# Altium integrated library Wuerth Elektronik Common Mode Power Line Choke.IntLib: 130 symbols
Pins are listed as number, name and electrical type; pins without a type are passive.

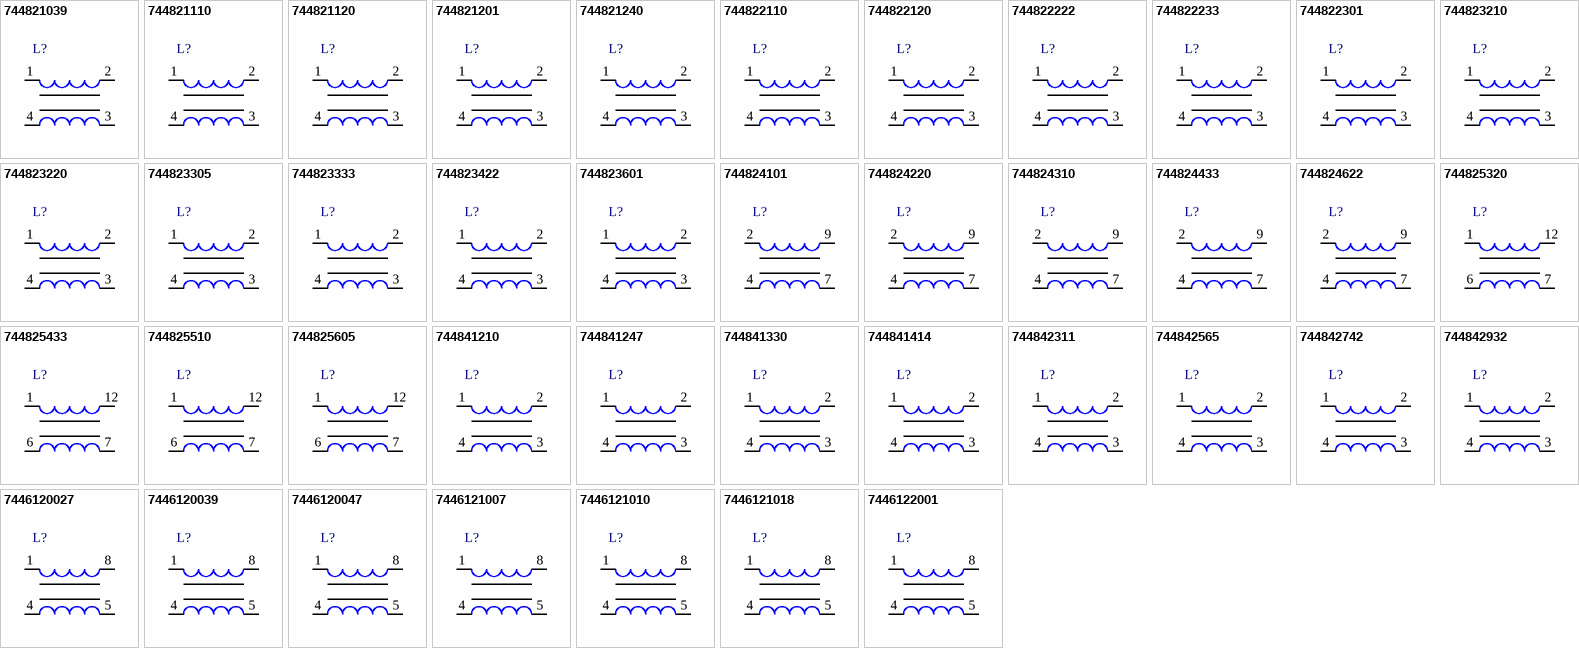
[diagram p0: symbols 744821039 to 7446122001]

## 744821039
designator L?
THT Common Mode Power Line Choke WE-CMB, L = 39.0 mH; Inductance: 39.0 mH; DatasheetVersion: ver 1, Oct-2004; PackageVersion: 2004; PackageReference: WE-CMB-XS; PackageDescription: THT Inductor, 2-Leads, Body 15.0 x 7.5 mm; ComponentLink1Description: Manufacturer URL; ComponentLink1URL: http://www.we-online.com; ComponentLink2Description: Datasheet; ComponentLink2URL: http://www.we-online.de/katalog/media/pdf/744821039.pdf
footprint WE-CMB-XS (THT Inductor, 2-Leads, Body 15.0x7.5x18.0 mm)
pins: 1, 2, 3, 4

## 744821110
designator L?
THT Common Mode Power Line Choke WE-CMB, L = 10.0 mH; Inductance: 10.0 mH; DatasheetVersion: ver 1, Oct-2004; PackageVersion: 2004; PackageReference: WE-CMB-XS; PackageDescription: THT Inductor, 2-Leads, Body 15.0 x 7.5 mm; ComponentLink1Description: Manufacturer URL; ComponentLink1URL: http://www.we-online.com; ComponentLink2Description: Datasheet; ComponentLink2URL: http://www.we-online.de/katalog/media/pdf/744821110.pdf
footprint WE-CMB-XS (THT Inductor, 2-Leads, Body 15.0x7.5x18.0 mm)
pins: 1, 2, 3, 4

## 744821120
designator L?
THT Common Mode Power Line Choke WE-CMB, L = 20.0 mH; Inductance: 20.0 mH; DatasheetVersion: ver 2, Jun-2005; PackageVersion: 2004; PackageReference: WE-CMB-XS; PackageDescription: THT Inductor, 2-Leads, Body 15.0 x 7.5 mm; ComponentLink1Description: Manufacturer URL; ComponentLink1URL: http://www.we-online.com; ComponentLink2Description: Datasheet; ComponentLink2URL: http://www.we-online.de/katalog/media/pdf/744821120.pdf
footprint WE-CMB-XS (THT Inductor, 2-Leads, Body 15.0x7.5x18.0 mm)
pins: 1, 2, 3, 4

## 744821201
designator L?
THT Common Mode Power Line Choke WE-CMB, L = 1.00 mH; Inductance: 1.00 mH; DatasheetVersion: ver 1, Oct-2004; PackageVersion: 2004; PackageReference: WE-CMB-XS; PackageDescription: THT Inductor, 2-Leads, Body 15.0 x 7.5 mm; ComponentLink1Description: Manufacturer URL; ComponentLink1URL: http://www.we-online.com; ComponentLink2Description: Datasheet; ComponentLink2URL: http://www.we-online.de/katalog/media/pdf/744821201.pdf
footprint WE-CMB-XS (THT Inductor, 2-Leads, Body 15.0x7.5x18.0 mm)
pins: 1, 2, 3, 4

## 744821240
designator L?
THT Common Mode Power Line Choke WE-CMB, L = 4.00 mH; Inductance: 4.00 mH; DatasheetVersion: ver 1, Oct-2004; PackageVersion: 2004; PackageReference: WE-CMB-XS; PackageDescription: THT Inductor, 2-Leads, Body 15.0 x 7.5 mm; ComponentLink1Description: Manufacturer URL; ComponentLink1URL: http://www.we-online.com; ComponentLink2Description: Datasheet; ComponentLink2URL: http://www.we-online.de/katalog/media/pdf/744821240.pdf
footprint WE-CMB-XS (THT Inductor, 2-Leads, Body 15.0x7.5x18.0 mm)
pins: 1, 2, 3, 4

## 744822110
designator L?
THT Common Mode Power Line Choke WE-CMB, L = 10.0 mH; Inductance: 10.0 mH; DatasheetVersion: ver 4, Oct-2004; PackageVersion: 2004; PackageReference: WE-CMB-S; PackageDescription: THT Inductor, 4-Leads, Body 17.5 x 13.0 mm; ComponentLink1Description: Manufacturer URL; ComponentLink1URL: http://www.we-online.com; ComponentLink2Description: Datasheet; ComponentLink2URL: http://www.we-online.de/katalog/media/pdf/744822110.pdf
footprint WE-CMB-S (THT Inductor, 4-Leads, Body 17.5x13.0x22.0 mm)
pins: 1, 2, 3, 4

## 744822120
designator L?
THT Common Mode Power Line Choke WE-CMB, L = 20.0 mH; Inductance: 20.0 mH; DatasheetVersion: ver 4, Oct-2004; PackageVersion: 2004; PackageReference: WE-CMB-S; PackageDescription: THT Inductor, 4-Leads, Body 17.5 x 13.0 mm; ComponentLink1Description: Manufacturer URL; ComponentLink1URL: http://www.we-online.com; ComponentLink2Description: Datasheet; ComponentLink2URL: http://www.we-online.de/katalog/media/pdf/744822120.pdf
footprint WE-CMB-S (THT Inductor, 4-Leads, Body 17.5x13.0x22.0 mm)
pins: 1, 2, 3, 4

## 744822222
designator L?
THT Common Mode Power Line Choke WE-CMB, L = 2.20 mH; Inductance: 2.20 mH; DatasheetVersion: ver 4, Oct-2004; PackageVersion: 2004; PackageReference: WE-CMB-S; PackageDescription: THT Inductor, 4-Leads, Body 17.5 x 13.0 mm; ComponentLink1Description: Manufacturer URL; ComponentLink1URL: http://www.we-online.com; ComponentLink2Description: Datasheet; ComponentLink2URL: http://www.we-online.de/katalog/media/pdf/744822222.pdf
footprint WE-CMB-S (THT Inductor, 4-Leads, Body 17.5x13.0x22.0 mm)
pins: 1, 2, 3, 4

## 744822233
designator L?
THT Common Mode Power Line Choke WE-CMB, L = 3.30 mH; Inductance: 3.30 mH; DatasheetVersion: ver 4, Oct-2004; PackageVersion: 2004; PackageReference: WE-CMB-S; PackageDescription: THT Inductor, 4-Leads, Body 17.5 x 13.0 mm; ComponentLink1Description: Manufacturer URL; ComponentLink1URL: http://www.we-online.com; ComponentLink2Description: Datasheet; ComponentLink2URL: http://www.we-online.de/katalog/media/pdf/744822233.pdf
footprint WE-CMB-S (THT Inductor, 4-Leads, Body 17.5x13.0x22.0 mm)
pins: 1, 2, 3, 4

## 744822301
designator L?
THT Common Mode Power Line Choke WE-CMB, L = 1.00 mH; Inductance: 1.00 mH; DatasheetVersion: ver 4, Oct-2004; PackageVersion: 2004; PackageReference: WE-CMB-S; PackageDescription: THT Inductor, 4-Leads, Body 17.5 x 13.0 mm; ComponentLink1Description: Manufacturer URL; ComponentLink1URL: http://www.we-online.com; ComponentLink2Description: Datasheet; ComponentLink2URL: http://www.we-online.de/katalog/media/pdf/744822301.pdf
footprint WE-CMB-S (THT Inductor, 4-Leads, Body 17.5x13.0x22.0 mm)
pins: 1, 2, 3, 4

## 744823210
designator L?
THT Common Mode Power Line Choke WE-CMB, L = 10.0 mH; Inductance: 10.0 mH; DatasheetVersion: ver 4, Oct-2004; PackageVersion: 2006; PackageReference: WE-CMB-M; PackageDescription: THT Inductor, 4-Leads, Body 25.0 x 17.0 mm; ComponentLink1Description: Manufacturer URL; ComponentLink1URL: http://www.we-online.com; ComponentLink2Description: Datasheet; ComponentLink2URL: http://www.we-online.de/katalog/media/pdf/744823210.pdf
footprint WE-CMB-M (THT Inductor, 4-Leads, Body 25.0x17.0x26.5 mm)
pins: 1, 2, 3, 4

## 744823220
designator L?
THT Common Mode Power Line Choke WE-CMB, L = 20.0 mH; Inductance: 20.0 mH; DatasheetVersion: ver 4, Oct-2004; PackageVersion: 2006; PackageReference: WE-CMB-M; PackageDescription: THT Inductor, 4-Leads, Body 25.0 x 17.0 mm; ComponentLink1Description: Manufacturer URL; ComponentLink1URL: http://www.we-online.com; ComponentLink2Description: Datasheet; ComponentLink2URL: http://www.we-online.de/katalog/media/pdf/744823220.pdf
footprint WE-CMB-M (THT Inductor, 4-Leads, Body 25.0x17.0x26.5 mm)
pins: 1, 2, 3, 4

## 744823305
designator L?
THT Common Mode Power Line Choke WE-CMB, L = 5.00 mH; Inductance: 5.00 mH; DatasheetVersion: ver 7, Nov-2006; PackageVersion: 2006; PackageReference: WE-CMB-M; PackageDescription: THT Inductor, 4-Leads, Body 25.0 x 17.0 mm; ComponentLink1Description: Manufacturer URL; ComponentLink1URL: http://www.we-online.com; ComponentLink2Description: Datasheet; ComponentLink2URL: http://www.we-online.de/katalog/media/pdf/744823305.pdf
footprint WE-CMB-M (THT Inductor, 4-Leads, Body 25.0x17.0x26.5 mm)
pins: 1, 2, 3, 4

## 744823333
designator L?
THT Common Mode Power Line Choke WE-CMB, L = 3.30 mH; Inductance: 3.30 mH; DatasheetVersion: ver 4, Oct-2004; PackageVersion: 2006; PackageReference: WE-CMB-M; PackageDescription: THT Inductor, 4-Leads, Body 25.0 x 17.0 mm; ComponentLink1Description: Manufacturer URL; ComponentLink1URL: http://www.we-online.com; ComponentLink2Description: Datasheet; ComponentLink2URL: http://www.we-online.de/katalog/media/pdf/744823333.pdf
footprint WE-CMB-M (THT Inductor, 4-Leads, Body 25.0x17.0x26.5 mm)
pins: 1, 2, 3, 4

## 744823422
designator L?
THT Common Mode Power Line Choke WE-CMB, L = 2.20 mH; Inductance: 2.20 mH; DatasheetVersion: ver 8, Jan-2008; PackageVersion: 2006; PackageReference: WE-CMB-M; PackageDescription: THT Inductor, 4-Leads, Body 25.0 x 17.0 mm; ComponentLink1Description: Manufacturer URL; ComponentLink1URL: http://www.we-online.com; ComponentLink2Description: Datasheet; ComponentLink2URL: http://www.we-online.de/katalog/media/pdf/744823422.pdf
footprint WE-CMB-M (THT Inductor, 4-Leads, Body 25.0x17.0x26.5 mm)
pins: 1, 2, 3, 4

## 744823601
designator L?
THT Common Mode Power Line Choke WE-CMB, L = 1.00 mH; Inductance: 1.00 mH; DatasheetVersion: ver 6, Jun-2006; PackageVersion: 2006; PackageReference: WE-CMB-M; PackageDescription: THT Inductor, 4-Leads, Body 25.0 x 17.0 mm; ComponentLink1Description: Manufacturer URL; ComponentLink1URL: http://www.we-online.com; ComponentLink2Description: Datasheet; ComponentLink2URL: http://www.we-online.de/katalog/media/pdf/744823601.pdf
footprint WE-CMB-M (THT Inductor, 4-Leads, Body 25.0x17.0x26.5 mm)
pins: 1, 2, 3, 4

## 744824101
designator L?
THT Common Mode Power Line Choke WE-CMB, L = 1.00 mH; Inductance: 1.00 mH; DatasheetVersion: ver 5, Oct-2004; PackageVersion: 2004; PackageReference: WE-CMB-L; PackageDescription: THT Inductor, 4-Leads, Body 27.5 x 18.5 mm; ComponentLink1Description: Manufacturer URL; ComponentLink1URL: http://www.we-online.com; ComponentLink2Description: Datasheet; ComponentLink2URL: http://www.we-online.de/katalog/media/pdf/744824101.pdf
footprint WE-CMB-L (THT Inductor, 4-Leads, Body 27.5x18.5x33.0 mm)
pins: 2, 4, 7, 9

## 744824220
designator L?
THT Common Mode Power Line Choke WE-CMB, L = 20.0 mH; Inductance: 20.0 mH; DatasheetVersion: ver 5, Oct-2004; PackageVersion: 2004; PackageReference: WE-CMB-L; PackageDescription: THT Inductor, 4-Leads, Body 27.5 x 18.5 mm; ComponentLink1Description: Manufacturer URL; ComponentLink1URL: http://www.we-online.com; ComponentLink2Description: Datasheet; ComponentLink2URL: http://www.we-online.de/katalog/media/pdf/744824220.pdf
footprint WE-CMB-L (THT Inductor, 4-Leads, Body 27.5x18.5x33.0 mm)
pins: 2, 4, 7, 9

## 744824310
designator L?
THT Common Mode Power Line Choke WE-CMB, L = 10.0 mH; Inductance: 10.0 mH; DatasheetVersion: ver 5, Oct-2004; PackageVersion: 2004; PackageReference: WE-CMB-L; PackageDescription: THT Inductor, 4-Leads, Body 27.5 x 18.5 mm; ComponentLink1Description: Manufacturer URL; ComponentLink1URL: http://www.we-online.com; ComponentLink2Description: Datasheet; ComponentLink2URL: http://www.we-online.de/katalog/media/pdf/744824310.pdf
footprint WE-CMB-L (THT Inductor, 4-Leads, Body 27.5x18.5x33.0 mm)
pins: 2, 4, 7, 9

## 744824433
designator L?
THT Common Mode Power Line Choke WE-CMB, L = 3.30 mH; Inductance: 3.30 mH; DatasheetVersion: ver 5, Oct-2004; PackageVersion: 2004; PackageReference: WE-CMB-L; PackageDescription: THT Inductor, 4-Leads, Body 27.5 x 18.5 mm; ComponentLink1Description: Manufacturer URL; ComponentLink1URL: http://www.we-online.com; ComponentLink2Description: Datasheet; ComponentLink2URL: http://www.we-online.de/katalog/media/pdf/744824433.pdf
footprint WE-CMB-L (THT Inductor, 4-Leads, Body 27.5x18.5x33.0 mm)
pins: 2, 4, 7, 9

## 744824622
designator L?
THT Common Mode Power Line Choke WE-CMB, L = 2.20 mH; Inductance: 2.20 mH; DatasheetVersion: ver 5, Oct-2004; PackageVersion: 2004; PackageReference: WE-CMB-L; PackageDescription: THT Inductor, 4-Leads, Body 27.5 x 18.5 mm; ComponentLink1Description: Manufacturer URL; ComponentLink1URL: http://www.we-online.com; ComponentLink2Description: Datasheet; ComponentLink2URL: http://www.we-online.de/katalog/media/pdf/744824622.pdf
footprint WE-CMB-L (THT Inductor, 4-Leads, Body 27.5x18.5x33.0 mm)
pins: 2, 4, 7, 9

## 744825320
designator L?
THT Common Mode Power Line Choke WE-CMB, L = 20.0 mH; Inductance: 20.0 mH; DatasheetVersion: ver 4, Oct-2004; PackageVersion: 2004; PackageReference: WE-CMB-XL; PackageDescription: THT Inductor, 4-Leads, Body 30.0 x 21.0 mm; ComponentLink1Description: Manufacturer URL; ComponentLink1URL: http://www.we-online.com; ComponentLink2Description: Datasheet; ComponentLink2URL: http://www.we-online.de/katalog/media/pdf/744825320.pdf
footprint WE-CMB-XL (THT Inductor, 4-Leads, Body 30.0x21.0x35.0 mm)
pins: 1, 6, 7, 12

## 744825433
designator L?
THT Common Mode Power Line Choke WE-CMB, L = 33.0 mH; Inductance: 33.0 mH; DatasheetVersion: ver 6, Jul-2006; PackageVersion: 2004; PackageReference: WE-CMB-XL; PackageDescription: THT Inductor, 4-Leads, Body 30.0 x 21.0 mm; ComponentLink1Description: Manufacturer URL; ComponentLink1URL: http://www.we-online.com; ComponentLink2Description: Datasheet; ComponentLink2URL: http://www.we-online.de/katalog/media/pdf/744825433.pdf
footprint WE-CMB-XL (THT Inductor, 4-Leads, Body 30.0x21.0x35.0 mm)
pins: 1, 6, 7, 12

## 744825510
designator L?
THT Common Mode Power Line Choke WE-CMB, L = 10.0 mH; Inductance: 10.0 mH; DatasheetVersion: ver 4, Oct-2004; PackageVersion: 2004; PackageReference: WE-CMB-XL; PackageDescription: THT Inductor, 4-Leads, Body 30.0 x 21.0 mm; ComponentLink1Description: Manufacturer URL; ComponentLink1URL: http://www.we-online.com; ComponentLink2Description: Datasheet; ComponentLink2URL: http://www.we-online.de/katalog/media/pdf/744825510.pdf
footprint WE-CMB-XL (THT Inductor, 4-Leads, Body 30.0x21.0x35.0 mm)
pins: 1, 6, 7, 12

## 744825605
designator L?
THT Common Mode Power Line Choke WE-CMB, L = 5.00 mH; Inductance: 5.00 mH; DatasheetVersion: ver 4, Oct-2004; PackageVersion: 2004; PackageReference: WE-CMB-XL; PackageDescription: THT Inductor, 4-Leads, Body 30.0 x 21.0 mm; ComponentLink1Description: Manufacturer URL; ComponentLink1URL: http://www.we-online.com; ComponentLink2Description: Datasheet; ComponentLink2URL: http://www.we-online.de/katalog/media/pdf/744825605.pdf
footprint WE-CMB-XL (THT Inductor, 4-Leads, Body 30.0x21.0x35.0 mm)
pins: 1, 6, 7, 12

## 744841210
designator L?
THT Common Mode Power Line Choke WE-CMB NiZn, L = 100 µH; Inductance: 100 µH; DatasheetVersion: ver 1, Dec-2005; PackageVersion: 2005; PackageReference: WE-CMB-HC-XS; PackageDescription: THT Inductor, 4-Leads, Body 15.5 x 7.5 mm; ComponentLink1Description: Manufacturer URL; ComponentLink1URL: http://www.we-online.com; ComponentLink2Description: Datasheet; ComponentLink2URL: http://www.we-online.de/katalog/media/pdf/744841210.pdf
footprint WE-CMB-HC-XS (THT Inductor, 4-Leads, Body 15.5x7.5x17.5 mm)
pins: 1, 2, 3, 4

## 744841247
designator L?
THT Common Mode Power Line Choke WE-CMB NiZn, L = 47.0 µH; Inductance: 47.0 µH; DatasheetVersion: ver 1, Dec-2005; PackageVersion: 2005; PackageReference: WE-CMB-HC-XS; PackageDescription: THT Inductor, 4-Leads, Body 15.5 x 7.5 mm; ComponentLink1Description: Manufacturer URL; ComponentLink1URL: http://www.we-online.com; ComponentLink2Description: Datasheet; ComponentLink2URL: http://www.we-online.de/katalog/media/pdf/744841247.pdf
footprint WE-CMB-HC-XS (THT Inductor, 4-Leads, Body 15.5x7.5x17.5 mm)
pins: 1, 2, 3, 4

## 744841330
designator L?
THT Common Mode Power Line Choke WE-CMB NiZn, L = 30.0 µH; Inductance: 30.0 µH; DatasheetVersion: ver 1, Dec-2005; PackageVersion: 2005; PackageReference: WE-CMB-HC-XS; PackageDescription: THT Inductor, 4-Leads, Body 15.5 x 7.5 mm; ComponentLink1Description: Manufacturer URL; ComponentLink1URL: http://www.we-online.com; ComponentLink2Description: Datasheet; ComponentLink2URL: http://www.we-online.de/katalog/media/pdf/744841330.pdf
footprint WE-CMB-HC-XS (THT Inductor, 4-Leads, Body 15.5x7.5x17.5 mm)
pins: 1, 2, 3, 4

## 744841414
designator L?
THT Common Mode Power Line Choke WE-CMB NiZn, L = 14.0 µH; Inductance: 14.0 µH; DatasheetVersion: ver 1, Dec-2005; PackageVersion: 2005; PackageReference: WE-CMB-HC-XS; PackageDescription: THT Inductor, 4-Leads, Body 15.5 x 7.5 mm; ComponentLink1Description: Manufacturer URL; ComponentLink1URL: http://www.we-online.com; ComponentLink2Description: Datasheet; ComponentLink2URL: http://www.we-online.de/katalog/media/pdf/744841414.pdf
footprint WE-CMB-HC-XS (THT Inductor, 4-Leads, Body 15.5x7.5x17.5 mm)
pins: 1, 2, 3, 4

## 744842311
designator L?
THT Common Mode Power Line Choke WE-CMB NiZn, L = 110 µH; Inductance: 110 µH; DatasheetVersion: Aug-2008; PackageVersion: 2008; PackageReference: WE-CMB-HC-S-A; PackageDescription: THT Inductor, 4-Leads, Body 18.5 x 14.5 mm; ComponentLink1Description: Manufacturer URL; ComponentLink1URL: http://www.we-online.com; ComponentLink2Description: Datasheet; ComponentLink2URL: http://www.we-online.de/katalog/media/pdf/744842311.pdf
footprint WE-CMB-HC-S-A (THT Inductor, 4-Leads, Body 18.5x14.5x22.0 mm)
pins: 1, 2, 3, 4

## 744842565
designator L?
THT Common Mode Power Line Choke WE-CMB NiZn, L = 65.0 µH; Inductance: 65.0 µH; DatasheetVersion: Aug-2008; PackageVersion: 2008; PackageReference: WE-CMB-HC-S-A; PackageDescription: THT Inductor, 4-Leads, Body 18.5 x 14.5 mm; ComponentLink1Description: Manufacturer URL; ComponentLink1URL: http://www.we-online.com; ComponentLink2Description: Datasheet; ComponentLink2URL: http://www.we-online.de/katalog/media/pdf/744842565.pdf
footprint WE-CMB-HC-S-A (THT Inductor, 4-Leads, Body 18.5x14.5x22.0 mm)
pins: 1, 2, 3, 4

## 744842742
designator L?
THT Common Mode Power Line Choke WE-CMB NiZn, L = 42.0 µH; Inductance: 42.0 µH; DatasheetVersion: Aug-2008; PackageVersion: 2008; PackageReference: WE-CMB-HC-S-A; PackageDescription: THT Inductor, 4-Leads, Body 18.5 x 14.5 mm; ComponentLink1Description: Manufacturer URL; ComponentLink1URL: http://www.we-online.com; ComponentLink2Description: Datasheet; ComponentLink2URL: http://www.we-online.de/katalog/media/pdf/744842742.pdf
footprint WE-CMB-HC-S-A (THT Inductor, 4-Leads, Body 18.5x14.5x22.0 mm)
pins: 1, 2, 3, 4

## 744842932
designator L?
THT Common Mode Power Line Choke WE-CMB NiZn, L = 32.0 µH; Inductance: 32.0 µH; DatasheetVersion: Aug-2008; PackageVersion: 2008; PackageReference: WE-CMB-HC-S-A; PackageDescription: THT Inductor, 4-Leads, Body 18.5 x 14.5 mm; ComponentLink1Description: Manufacturer URL; ComponentLink1URL: http://www.we-online.com; ComponentLink2Description: Datasheet; ComponentLink2URL: http://www.we-online.de/katalog/media/pdf/744842932.pdf
footprint WE-CMB-HC-S-A (THT Inductor, 4-Leads, Body 18.5x14.5x22.0 mm)
pins: 1, 2, 3, 4

## 7446120027
designator L?
THT Common Mode Power Line Choke WE-LF, L = 27.0 mH; Inductance: 27.0 mH; DatasheetVersion: ver 2, Nov-2005; PackageVersion: 2005; PackageReference: WE-LF-SV; PackageDescription: THT Inductor, 4-Leads, Body 18.5 x 13.5 mm; ComponentLink1Description: Manufacturer URL; ComponentLink1URL: http://www.we-online.com; ComponentLink2Description: Datasheet; ComponentLink2URL: http://www.we-online.de/katalog/media/pdf/7446120027.pdf
footprint WE-LF-SV (THT Inductor, 4-Leads, Body 18.5x13.5x20.5 mm)
pins: 1, 4, 5, 8

## 7446120039
designator L?
THT Common Mode Power Line Choke WE-LF, L = 39.0 mH; Inductance: 39.0 mH; DatasheetVersion: ver 2, Nov-2005; PackageVersion: 2005; PackageReference: WE-LF-SV; PackageDescription: THT Inductor, 4-Leads, Body 18.5 x 13.5 mm; ComponentLink1Description: Manufacturer URL; ComponentLink1URL: http://www.we-online.com; ComponentLink2Description: Datasheet; ComponentLink2URL: http://www.we-online.de/katalog/media/pdf/7446120039.pdf
footprint WE-LF-SV (THT Inductor, 4-Leads, Body 18.5x13.5x20.5 mm)
pins: 1, 4, 5, 8

## 7446120047
designator L?
THT Common Mode Power Line Choke WE-LF, L = 47.0 mH; Inductance: 47.0 mH; DatasheetVersion: ver 2, Nov-2005; PackageVersion: 2005; PackageReference: WE-LF-SV; PackageDescription: THT Inductor, 4-Leads, Body 18.5 x 13.5 mm; ComponentLink1Description: Manufacturer URL; ComponentLink1URL: http://www.we-online.com; ComponentLink2Description: Datasheet; ComponentLink2URL: http://www.we-online.de/katalog/media/pdf/7446120047.pdf
footprint WE-LF-SV (THT Inductor, 4-Leads, Body 18.5x13.5x20.5 mm)
pins: 1, 4, 5, 8

## 7446121007
designator L?
THT Common Mode Power Line Choke WE-LF, L = 6.80 mH; Inductance: 6.80 mH; DatasheetVersion: ver 2, Nov-2005; PackageVersion: 2005; PackageReference: WE-LF-SV; PackageDescription: THT Inductor, 4-Leads, Body 18.5 x 13.5 mm; ComponentLink1Description: Manufacturer URL; ComponentLink1URL: http://www.we-online.com; ComponentLink2Description: Datasheet; ComponentLink2URL: http://www.we-online.de/katalog/media/pdf/7446121007.pdf
footprint WE-LF-SV (THT Inductor, 4-Leads, Body 18.5x13.5x20.5 mm)
pins: 1, 4, 5, 8

## 7446121010
designator L?
THT Common Mode Power Line Choke WE-LF, L = 10.0 mH; Inductance: 10.0 mH; DatasheetVersion: ver 2, Nov-2005; PackageVersion: 2005; PackageReference: WE-LF-SV; PackageDescription: THT Inductor, 4-Leads, Body 18.5 x 13.5 mm; ComponentLink1Description: Manufacturer URL; ComponentLink1URL: http://www.we-online.com; ComponentLink2Description: Datasheet; ComponentLink2URL: http://www.we-online.de/katalog/media/pdf/7446121010.pdf
footprint WE-LF-SV (THT Inductor, 4-Leads, Body 18.5x13.5x20.5 mm)
pins: 1, 4, 5, 8

## 7446121018
designator L?
THT Common Mode Power Line Choke WE-LF, L = 18.0 mH; Inductance: 18.0 mH; DatasheetVersion: ver 2, Nov-2005; PackageVersion: 2005; PackageReference: WE-LF-SV; PackageDescription: THT Inductor, 4-Leads, Body 18.5 x 13.5 mm; ComponentLink1Description: Manufacturer URL; ComponentLink1URL: http://www.we-online.com; ComponentLink2Description: Datasheet; ComponentLink2URL: http://www.we-online.de/katalog/media/pdf/7446121018.pdf
footprint WE-LF-SV (THT Inductor, 4-Leads, Body 18.5x13.5x20.5 mm)
pins: 1, 4, 5, 8

## 7446122001
designator L?
THT Common Mode Power Line Choke WE-LF, L = 1.00 mH; Inductance: 1.00 mH; DatasheetVersion: ver 2, Nov-2005; PackageVersion: 2005; PackageReference: WE-LF-SV; PackageDescription: THT Inductor, 4-Leads, Body 18.5 x 13.5 mm; ComponentLink1Description: Manufacturer URL; ComponentLink1URL: http://www.we-online.com; ComponentLink2Description: Datasheet; ComponentLink2URL: http://www.we-online.de/katalog/media/pdf/7446122001.pdf
footprint WE-LF-SV (THT Inductor, 4-Leads, Body 18.5x13.5x20.5 mm)
pins: 1, 4, 5, 8

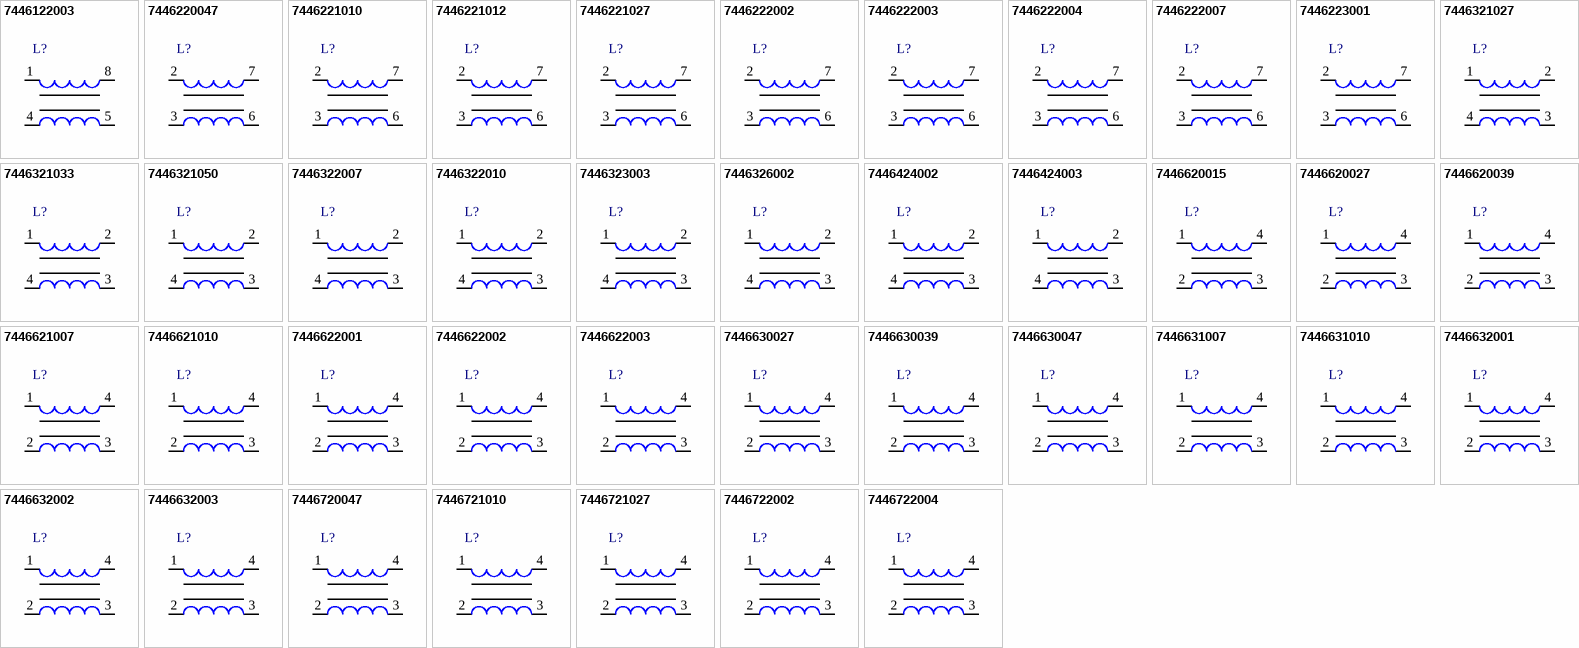
[diagram p1: symbols 7446122003 to 7446722004]

## 7446122003
designator L?
THT Common Mode Power Line Choke WE-LF, L = 3.30 mH; Inductance: 3.30 mH; DatasheetVersion: ver 2, Nov-2005; PackageVersion: 2005; PackageReference: WE-LF-SV; PackageDescription: THT Inductor, 4-Leads, Body 18.5 x 13.5 mm; ComponentLink1Description: Manufacturer URL; ComponentLink1URL: http://www.we-online.com; ComponentLink2Description: Datasheet; ComponentLink2URL: http://www.we-online.de/katalog/media/pdf/7446122003.pdf
footprint WE-LF-SV (THT Inductor, 4-Leads, Body 18.5x13.5x20.5 mm)
pins: 1, 4, 5, 8

## 7446220047
designator L?
THT Common Mode Power Line Choke WE-LF, L = 47.0 mH; Inductance: 47.0 mH; DatasheetVersion: ver 3, Nov-2005; PackageVersion: 2005; PackageReference: WE-LF-MV; PackageDescription: THT Inductor, 4-Leads, Body 23.5 x 16.0 mm; ComponentLink1Description: Manufacturer URL; ComponentLink1URL: http://www.we-online.com; ComponentLink2Description: Datasheet; ComponentLink2URL: http://www.we-online.de/katalog/media/pdf/7446220047.pdf
footprint WE-LF-MV (THT Inductor, 4-Leads, Body 23.5x16.0x25.5 mm)
pins: 2, 3, 6, 7

## 7446221010
designator L?
THT Common Mode Power Line Choke WE-LF, L = 10.0 mH; Inductance: 10.0 mH; DatasheetVersion: ver 3, Nov-2005; PackageVersion: 2005; PackageReference: WE-LF-MV; PackageDescription: THT Inductor, 4-Leads, Body 23.5 x 16.0 mm; ComponentLink1Description: Manufacturer URL; ComponentLink1URL: http://www.we-online.com; ComponentLink2Description: Datasheet; ComponentLink2URL: http://www.we-online.de/katalog/media/pdf/7446221010.pdf
footprint WE-LF-MV (THT Inductor, 4-Leads, Body 23.5x16.0x25.5 mm)
pins: 2, 3, 6, 7

## 7446221012
designator L?
THT Common Mode Power Line Choke WE-LF, L = 12.0 mH; Inductance: 12.0 mH; DatasheetVersion: ver 3, Nov-2005; PackageVersion: 2005; PackageReference: WE-LF-MV; PackageDescription: THT Inductor, 4-Leads, Body 23.5 x 16.0 mm; ComponentLink1Description: Manufacturer URL; ComponentLink1URL: http://www.we-online.com; ComponentLink2Description: Datasheet; ComponentLink2URL: http://www.we-online.de/katalog/media/pdf/7446221012.pdf
footprint WE-LF-MV (THT Inductor, 4-Leads, Body 23.5x16.0x25.5 mm)
pins: 2, 3, 6, 7

## 7446221027
designator L?
THT Common Mode Power Line Choke WE-LF, L = 27.0 mH; Inductance: 27.0 mH; DatasheetVersion: ver 3, Nov-2005; PackageVersion: 2005; PackageReference: WE-LF-MV; PackageDescription: THT Inductor, 4-Leads, Body 23.5 x 16.0 mm; ComponentLink1Description: Manufacturer URL; ComponentLink1URL: http://www.we-online.com; ComponentLink2Description: Datasheet; ComponentLink2URL: http://www.we-online.de/katalog/media/pdf/7446221027.pdf
footprint WE-LF-MV (THT Inductor, 4-Leads, Body 23.5x16.0x25.5 mm)
pins: 2, 3, 6, 7

## 7446222002
designator L?
THT Common Mode Power Line Choke WE-LF, L = 2.20 mH; Inductance: 2.20 mH; DatasheetVersion: ver 3, Nov-2005; PackageVersion: 2005; PackageReference: WE-LF-MV; PackageDescription: THT Inductor, 4-Leads, Body 23.5 x 16.0 mm; ComponentLink1Description: Manufacturer URL; ComponentLink1URL: http://www.we-online.com; ComponentLink2Description: Datasheet; ComponentLink2URL: http://www.we-online.de/katalog/media/pdf/7446222002.pdf
footprint WE-LF-MV (THT Inductor, 4-Leads, Body 23.5x16.0x25.5 mm)
pins: 2, 3, 6, 7

## 7446222003
designator L?
THT Common Mode Power Line Choke WE-LF, L = 3.30 mH; Inductance: 3.30 mH; DatasheetVersion: ver 3, Nov-2005; PackageVersion: 2005; PackageReference: WE-LF-MV; PackageDescription: THT Inductor, 4-Leads, Body 23.5 x 16.0 mm; ComponentLink1Description: Manufacturer URL; ComponentLink1URL: http://www.we-online.com; ComponentLink2Description: Datasheet; ComponentLink2URL: http://www.we-online.de/katalog/media/pdf/7446222003.pdf
footprint WE-LF-MV (THT Inductor, 4-Leads, Body 23.5x16.0x25.5 mm)
pins: 2, 3, 6, 7

## 7446222004
designator L?
THT Common Mode Power Line Choke WE-LF, L = 4.20 mH; Inductance: 4.20 mH; DatasheetVersion: ver 3, Nov-2005; PackageVersion: 2005; PackageReference: WE-LF-MV; PackageDescription: THT Inductor, 4-Leads, Body 23.5 x 16.0 mm; ComponentLink1Description: Manufacturer URL; ComponentLink1URL: http://www.we-online.com; ComponentLink2Description: Datasheet; ComponentLink2URL: http://www.we-online.de/katalog/media/pdf/7446222004.pdf
footprint WE-LF-MV (THT Inductor, 4-Leads, Body 23.5x16.0x25.5 mm)
pins: 2, 3, 6, 7

## 7446222007
designator L?
THT Common Mode Power Line Choke WE-LF, L = 6.80 mH; Inductance: 6.80 mH; DatasheetVersion: ver 3, Nov-2005; PackageVersion: 2005; PackageReference: WE-LF-MV; PackageDescription: THT Inductor, 4-Leads, Body 23.5 x 16.0 mm; ComponentLink1Description: Manufacturer URL; ComponentLink1URL: http://www.we-online.com; ComponentLink2Description: Datasheet; ComponentLink2URL: http://www.we-online.de/katalog/media/pdf/7446222007.pdf
footprint WE-LF-MV (THT Inductor, 4-Leads, Body 23.5x16.0x25.5 mm)
pins: 2, 3, 6, 7

## 7446223001
designator L?
THT Common Mode Power Line Choke WE-LF, L = 1.00 mH; Inductance: 1.00 mH; DatasheetVersion: ver 3, Nov-2005; PackageVersion: 2005; PackageReference: WE-LF-MV; PackageDescription: THT Inductor, 4-Leads, Body 23.5 x 16.0 mm; ComponentLink1Description: Manufacturer URL; ComponentLink1URL: http://www.we-online.com; ComponentLink2Description: Datasheet; ComponentLink2URL: http://www.we-online.de/katalog/media/pdf/7446223001.pdf
footprint WE-LF-MV (THT Inductor, 4-Leads, Body 23.5x16.0x25.5 mm)
pins: 2, 3, 6, 7

## 7446321027
designator L?
THT Common Mode Power Line Choke WE-LF, L = 27.0 mH; Inductance: 27.0 mH; DatasheetVersion: ver 4, Nov-2005; PackageVersion: 2005; PackageReference: WE-LF-LV; PackageDescription: THT Inductor, 4-Leads, Body 26.5 x 18.5 mm; ComponentLink1Description: Manufacturer URL; ComponentLink1URL: http://www.we-online.com; ComponentLink2Description: Datasheet; ComponentLink2URL: http://www.we-online.de/katalog/media/pdf/7446321027.pdf
footprint WE-LF-LV (THT Inductor, 4-Leads, Body 26.5x18.5x30.5 mm)
pins: 1, 2, 3, 4

## 7446321033
designator L?
THT Common Mode Power Line Choke WE-LF, L = 33.0 mH; Inductance: 33.0 mH; DatasheetVersion: ver 4, Nov-2005; PackageVersion: 2005; PackageReference: WE-LF-LV; PackageDescription: THT Inductor, 4-Leads, Body 26.5 x 18.5 mm; ComponentLink1Description: Manufacturer URL; ComponentLink1URL: http://www.we-online.com; ComponentLink2Description: Datasheet; ComponentLink2URL: http://www.we-online.de/katalog/media/pdf/7446321033.pdf
footprint WE-LF-LV (THT Inductor, 4-Leads, Body 26.5x18.5x30.5 mm)
pins: 1, 2, 3, 4

## 7446321050
designator L?
THT Common Mode Power Line Choke WE-LF, L = 50.0 mH; Inductance: 50.0 mH; DatasheetVersion: ver 4, Nov-2005; PackageVersion: 2005; PackageReference: WE-LF-LV; PackageDescription: THT Inductor, 4-Leads, Body 26.5 x 18.5 mm; ComponentLink1Description: Manufacturer URL; ComponentLink1URL: http://www.we-online.com; ComponentLink2Description: Datasheet; ComponentLink2URL: http://www.we-online.de/katalog/media/pdf/7446321050.pdf
footprint WE-LF-LV (THT Inductor, 4-Leads, Body 26.5x18.5x30.5 mm)
pins: 1, 2, 3, 4

## 7446322007
designator L?
THT Common Mode Power Line Choke WE-LF, L = 6.80 mH; Inductance: 6.80 mH; DatasheetVersion: ver 4, Nov-2005; PackageVersion: 2005; PackageReference: WE-LF-LV; PackageDescription: THT Inductor, 4-Leads, Body 26.5 x 18.5 mm; ComponentLink1Description: Manufacturer URL; ComponentLink1URL: http://www.we-online.com; ComponentLink2Description: Datasheet; ComponentLink2URL: http://www.we-online.de/katalog/media/pdf/7446322007.pdf
footprint WE-LF-LV (THT Inductor, 4-Leads, Body 26.5x18.5x30.5 mm)
pins: 1, 2, 3, 4

## 7446322010
designator L?
THT Common Mode Power Line Choke WE-LF, L = 10.0 mH; Inductance: 10.0 mH; DatasheetVersion: ver 4, Nov-2005; PackageVersion: 2005; PackageReference: WE-LF-LV; PackageDescription: THT Inductor, 4-Leads, Body 26.5 x 18.5 mm; ComponentLink1Description: Manufacturer URL; ComponentLink1URL: http://www.we-online.com; ComponentLink2Description: Datasheet; ComponentLink2URL: http://www.we-online.de/katalog/media/pdf/7446322010.pdf
footprint WE-LF-LV (THT Inductor, 4-Leads, Body 26.5x18.5x30.5 mm)
pins: 1, 2, 3, 4

## 7446323003
designator L?
THT Common Mode Power Line Choke WE-LF, L = 2.70 mH; Inductance: 2.70 mH; DatasheetVersion: ver 4, Nov-2005; PackageVersion: 2005; PackageReference: WE-LF-LV; PackageDescription: THT Inductor, 4-Leads, Body 26.5 x 18.5 mm; ComponentLink1Description: Manufacturer URL; ComponentLink1URL: http://www.we-online.com; ComponentLink2Description: Datasheet; ComponentLink2URL: http://www.we-online.de/katalog/media/pdf/7446323003.pdf
footprint WE-LF-LV (THT Inductor, 4-Leads, Body 26.5x18.5x30.5 mm)
pins: 1, 2, 3, 4

## 7446326002
designator L?
THT Common Mode Power Line Choke WE-LF, L = 1.80 mH; Inductance: 1.80 mH; DatasheetVersion: ver 4, Nov-2005; PackageVersion: 2005; PackageReference: WE-LF-LV; PackageDescription: THT Inductor, 4-Leads, Body 26.5 x 18.5 mm; ComponentLink1Description: Manufacturer URL; ComponentLink1URL: http://www.we-online.com; ComponentLink2Description: Datasheet; ComponentLink2URL: http://www.we-online.de/katalog/media/pdf/7446326002.pdf
footprint WE-LF-LV (THT Inductor, 4-Leads, Body 26.5x18.5x30.5 mm)
pins: 1, 2, 3, 4

## 7446424002
designator L?
THT Common Mode Power Line Choke WE-LF, L = 2.20 mH; Inductance: 2.20 mH; DatasheetVersion: ver 3, Nov-2005; PackageVersion: 2005; PackageReference: WE-LF-XV; PackageDescription: THT Inductor, 4-Leads, Body 32.5 x 21.5 mm; ComponentLink1Description: Manufacturer URL; ComponentLink1URL: http://www.we-online.com; ComponentLink2Description: Datasheet; ComponentLink2URL: http://www.we-online.de/katalog/media/pdf/7446424002.pdf
footprint WE-LF-XV (THT Inductor, 4-Leads, Body 32.5x21.5x35.5 mm)
pins: 1, 2, 3, 4

## 7446424003
designator L?
THT Common Mode Power Line Choke WE-LF, L = 3.30 mH; Inductance: 3.30 mH; DatasheetVersion: ver 3, Nov-2005; PackageVersion: 2005; PackageReference: WE-LF-XV; PackageDescription: THT Inductor, 4-Leads, Body 32.5 x 21.5 mm; ComponentLink1Description: Manufacturer URL; ComponentLink1URL: http://www.we-online.com; ComponentLink2Description: Datasheet; ComponentLink2URL: http://www.we-online.de/katalog/media/pdf/7446424003.pdf
footprint WE-LF-XV (THT Inductor, 4-Leads, Body 32.5x21.5x35.5 mm)
pins: 1, 2, 3, 4

## 7446620015
designator L?
THT Common Mode Power Line Choke WE-LF, L = 15.0 mH; Inductance: 15.0 mH; DatasheetVersion: ver 3, Nov-2005; PackageVersion: 2005; PackageReference: WE-LF-SH; PackageDescription: THT Inductor, 4-Leads, Body 18.0 x 18.0 mm; ComponentLink1Description: Manufacturer URL; ComponentLink1URL: http://www.we-online.com; ComponentLink2Description: Datasheet; ComponentLink2URL: http://www.we-online.de/katalog/media/pdf/7446620015.pdf
footprint WE-LF-SH (THT Inductor, 4-Leads, Body 18.0x18.0x13.0 mm)
pins: 1, 2, 3, 4

## 7446620027
designator L?
THT Common Mode Power Line Choke WE-LF, L = 27.0 mH; Inductance: 27.0 mH; DatasheetVersion: ver 3, Nov-2005; PackageVersion: 2005; PackageReference: WE-LF-SH; PackageDescription: THT Inductor, 4-Leads, Body 18.0 x 18.0 mm; ComponentLink1Description: Manufacturer URL; ComponentLink1URL: http://www.we-online.com; ComponentLink2Description: Datasheet; ComponentLink2URL: http://www.we-online.de/katalog/media/pdf/7446620027.pdf
footprint WE-LF-SH (THT Inductor, 4-Leads, Body 18.0x18.0x13.0 mm)
pins: 1, 2, 3, 4

## 7446620039
designator L?
THT Common Mode Power Line Choke WE-LF, L = 39.0 mH; Inductance: 39.0 mH; DatasheetVersion: ver 3, Nov-2005; PackageVersion: 2005; PackageReference: WE-LF-SH; PackageDescription: THT Inductor, 4-Leads, Body 18.0 x 18.0 mm; ComponentLink1Description: Manufacturer URL; ComponentLink1URL: http://www.we-online.com; ComponentLink2Description: Datasheet; ComponentLink2URL: http://www.we-online.de/katalog/media/pdf/7446620039.pdf
footprint WE-LF-SH (THT Inductor, 4-Leads, Body 18.0x18.0x13.0 mm)
pins: 1, 2, 3, 4

## 7446621007
designator L?
THT Common Mode Power Line Choke WE-LF, L = 6.80 mH; Inductance: 6.80 mH; DatasheetVersion: ver 3, Nov-2005; PackageVersion: 2005; PackageReference: WE-LF-SH; PackageDescription: THT Inductor, 4-Leads, Body 18.0 x 18.0 mm; ComponentLink1Description: Manufacturer URL; ComponentLink1URL: http://www.we-online.com; ComponentLink2Description: Datasheet; ComponentLink2URL: http://www.we-online.de/katalog/media/pdf/7446621007.pdf
footprint WE-LF-SH (THT Inductor, 4-Leads, Body 18.0x18.0x13.0 mm)
pins: 1, 2, 3, 4

## 7446621010
designator L?